# Altium integrated library Integrated_Library - 02.02.25 - 22.49.IntLib: 792 symbols (part 10 of 11) (continued)
## CMP-020-00021-3 (continued)

## CMP-020-00022-3
designator U?, comment STM32L452CEU6
ARM® Cortex®-M4 STM32L4 Microcontroller IC 32-Bit 80MHz 512KB (512K x 8) FLASH 48-UFQFPN (7x7); I/Os: 38; RAM Size: 160; Min Supply Voltage: 2V; ComponentLink1URL: http://www.st.com/; ComponentLink2Description: Datasheet; Mounting Technology: Surface Mount; ComponentLink2URL: http://www.st.com/st-web-ui/static/active/en/resource/technical/document/datasheet/CD00161566.pdf; Case/Package: UFQFN-48; Pins: 49; RoHS Compliant: Yes; ComponentLink1Description: Manufacturer URL
footprint STM-UFQFPN48_N (QFN, 48-Leads, Body 7.1x7.1mm, Pitch 0.5mm, Thermal Pad 5.6x5.6mm, IPC Medium Density)
footprint STM-UFQFPN48_N
pins: 1 VBAT (power), 2 PC13 (io), 3 PC14-OSC32_IN (io) "PC14/OSC32_IN", 4 PC15-OSC32_OUT (io) "PC15/OSC32_OUT", 5 OSC_IN (in) "OSC_IN/PD0", 6 OSC_OUT (out) "OSC_OUT/PD1", 7 NRST (io), 8 VSSA (power), 9 VDDA (power), 10 PA0-WKUP (io) "PA0/WKUP/USART2_CTS/ADC12_IN0/TIM2_CH1_ETR", 11 PA1 (io) "PA1/USART2_RTS/ADC12_IN1/TIM2_CH2", 12 PA2 (io) "PA2/USART2_TX/ADC12_IN2/TIM2_CH3", 13 PA3 (io) "PA3/USART2_RX/ADC12_IN3/TIM2_CH4", 14 PA4 (io) "PA4/SPI1_NSS/USART2_CK/ADC12_IN4", 15 PA5 (io) "PA5/SPI1_SCK/ADC12_IN5", 16 PA6 (io) "PA6/SPI1_MISO/ADC12_IN6/TIM3_CH1/TIM1_BKIN", 17 PA7 (io) "PA7/SPI1_MOSI/ADC12_IN7/TIM3_CH2/TIM1_CH1N", 18 PB0 (io) "PB0/ADC12_IN8/TIM3_CH3/TIM1_CH2N", 19 PB1 (io) "PB1/ADC12_IN9/TIM3_CH4/TIM1_CH3N", 20 PB2 (io) "PB2/BOOT1", 21 PB10 (io) "PB10/I2C2_SCL/USART3_TX/TIM2_CH3", 22 PB11 (io) "PB11/I2C2_SDA/USART3_RX/TIM2_CH4", 23 VSS (power), 24 VDD (power), 25 PB12 (io) "PB12/SPI2_NSS/I2C2_SMBAl/USART3_CK/TIM1_BKIN", 26 PB13 (io) "PB13/SPI2_SCK/USART3_CTS/TIM1_CH1N", 27 PB14 (io) "PB14/SPI2_MISO/USART3_RTS/TIM1_CH2N", 28 PB15 (io) "PB15/SPI2_MOSI/TIM1_CH3N", 29 PA8 (io) "PA8/USART1_CK/TIM1_CH1/MCO", 30 PA9 (io) "PA9/USART1_TX/TIM1_CH2", 31 PA10 (io) "PA10/USART1_RX/TIM1_CH3", 32 PA11 (io) "PA11/USART1_CTS/CANRX/USBDM/TIM1_CH4", 33 PA12 (io) "PA12/USART1_RTS/CANTX/USBDP/TIM1_ETR", 34 PA13 (io) "JTMS/SWDIO/PA13", 35 VSS (power), 36 VDDUSB (power), 37 PA14 (io) "JTCK/SWCLK/PA14", 38 PA15 (io) "JTDI/TIM2_CH1_ETR/PA15/SPI1_NSS", 39 PB3 (io) "JTDO/TIM2_CH2/PB3/TRACESWO/SPI1_SCK", 40 PB4 (io) "JNTRST/TIM3_CH1/PB4/SPI1_MISO", 41 PB5 (io) "PB5/ I2C1_SMBAI/TIM3_CH2/SPI1_MOSI", 42 PB6 (io) "PB6/I2C1_SCL/TIM4_CH1/USART1_TX", 43 PB7 (io) "PB7/I2C1_SDA/TIM4_CH2/USART1_RX", 44 BOOT0 (in), 45 PB8 (io) "PB8/TIM4_CH3/I2C1_SCL/CANRX", 46 PB9 (io) "PB9/TIM4_CH4/I2C1_SDA/CANTX", 47 VSS (power), 48 VDD (power), 49 EP

## CMP-021-00000-4
designator U?, comment SIM900
Quad-Band GSM / GPRS Module,  4 V, -30 to 80 degC, 68-Pin LCC; Manufacturer: Simcom; Voltage: 4V; Package Description: 68-Pin Leadless Ceramic Chip Carrier, Body 24 x 24 mm, Pitch 1 mm; Pins: 68; Datasheet URL: http://simcomm2m.com/UploadFile/TechnicalFile/SIM900_Hardware%20Design_V2.05.pdf; Package Reference: SIM900; Min Operating Temperature: -30°C; Max Operating Temperature: 80°C; Packaging: Unknown; Manufacturer URL: http://simcomm2m.com/; Case/Package: SIM900; Datasheet Version: Rev. 2.05, 08/2013; RoHS Compliant: Unknown; Mounting Technology: SM
footprint SIM-SIM900A_V (LCC, 68-Leads, Body 24x24mm, Pitch 1mm)
pins: 1 PWRKEY (in), 2 PWRKEY_OUT (out), 3 DTR (in), 4 RI (out), 5 DCD (out), 6 DSR (in), 7 CTS (out), 8 RTS (in), 9 TXD (out), 10 RXD (in), 11 DISP_CLK (out), 12 DISP_DATA (io), 13 DISP_D/C (out), 14 DISP_CS (out), 15 VDD_EXT (power), 16 ~{RESET} (in), 17 GND (power), 18 GND (power), 19 MIC_P (in), 20 MIC_N (in), 21 SPK_P (out), 22 SPK_N (out), 23 LINEIN_R (in), 24 LINEIN_L (in), 25 ADC (in), 26 VRTC (power), 27 DBG_TXD (out), 28 DBG_RXD (in), 29 GND (power), 30 SIM_VDD (out), 31 SIM_DATA (io), 32 SIM_CLK (out), 33 SIM_RST (out), 34 SIM_PRESENCE (in), 35 PWM1 (out), 36 PWM2 (out), 37 SDA (out), 38 SCL (io), 39 GND (power), 40 GPIO1/KBR4 (io), 41 GPIO2/KBR3 (io), 42 GPIO3/KBR2 (io), 43 GPIO4/KBR1 (io), 44 GPIO5/KBR0 (io), 45 GND (power), 46 GND (power), 47 GPIO6/KBC4 (io), 48 GPIO7/KBC3 (io), 49 GPIO8/KBC2 (io), 50 GPIO9/KBC1 (io), 51 GPIO10/KBC0 (io), 52 ~{ETLIGHT} (out), 53 GND (power), 54 GND (power), 55 VBAT (power), 56 VBAT (power), 57 VBAT (power), 58 GND (power), 59 GND (power), 60 RF_ANT (io), 61 GND (power), 62 GND (power), 63 GND (power), 64 GND (power), 65 GND (power), 66 STATUS (out), 67 GPIO11 (io), 68 GPIO12 (io)

## CMP-021-00001-2
designator U?, comment CC2540F256RHAR
2.4-GHz Bluetooth low Energy System-on-Chip, 256 KB, -40 to 85 degC, 40-Pin VQFN (RHA), Green (RoHS & no Sb/Br), Tape and Reel; Manufacturer: Texas Instruments (TI); Density: 128KB; RAM Size: 8KB; Max Supply Voltage: 3.6V; Min Supply Voltage: 2V; Data Rate: 1Mbps; RoHS Compliant: True; Case/Package: RHA0040J; Mounting Technology: SM; Package Quantity: 2500; Package Reference: RHA0040J; Packaging: TapeandReel; Max Operating Temperature: 85°C; Package Description: 40-Pin Quad Flat No-lead Package, Body 6 x 6 mm, Pitch 0.5 mm, Thermal Pad 4.5 x 4.5 mm; Pins: 40; Min Operating Temperature: -40°C; Datasheet URL: http://www.ti.com/lit/ds/symlink/cc2540.pdf; Datasheet Version: Apr-15; Manufacturer URL: http://www.ti.com/
footprint TI-RHA0040J_V (QFN, 40-Leads, Body 6x6mm, Pitch 0.5mm, Thermal Pad 4.5 x 4.5mm, TI Recommended)
pins: 1 DGND_USB (power) "Connect to GND", 2 USB_P (io) "USB P", 3 USB_N (io) "USB N", 4 DVDD_USB (power) "2-V-3.6-V digital power-supply connection", 5 P1_5 (io) "Port 1.5", 6 P1_4 (io) "Port 1.4", 7 P1_3 (io) "Port 1.3", 8 P1_2 (io) "Port 1.2", 9 P1_1 (io) "Port 1.1 - 20-mA drive capability", 10 DVDD2 (power) "2-V-3.6-V digital power-supply connection", 11 P1_0 (io) "Port 1.0 - 20-mA drive capability", 12 P0_7 (io) "Port 0.7", 13 P0_6 (io) "Port 0.6", 14 P0_5 (io) "Port 0.5", 15 P0_4 (io) "Port 0.4", 16 P0_3 (io) "Port 0.3", 17 P0_2 (io) "Port 0.2", 18 P0_1 (io) "Port 0.1", 19 P0_0 (io) "Port 0.0", 20 RESET_N (in) "Reset, active-low", 21 AVDD5 (power) "2-V-3.6-V analog power-supply connection", 22 XOSC_Q1 (in) "32-MHz crystal oscillator pin 1 or external-clock input", 23 XOSC_Q2 "32-MHz crystal oscillator pin 2", 24 AVDD3 (power) "2-V-3.6-V analog power-supply connection", 25 RF_P (io) "Positive RF input signal to LNA during RX. Positive RF output signal from PA during TX.", 26 RF_N (io) "Negative RF input signal to LNA during RX. Negative RF output signal from PA during TX.", 27 AVDD2 (power) "2-V-3.6-V analog power-supply connection", 28 AVDD1 (power) "2-V-3.6-V analog power-supply connection", 29 AVDD4 (power) "2-V-3.6-V analog power-supply connection", 30 RBIAS "External precision bias resistor for reference current", 31 AVDD6 (power) "2-V-3.6-V analog power-supply connection", 32 P2_4/XOSC32K_Q1 (io) "Port 2.4/32.768 kHz XOSC", 33 P2_3/XOSC32K_Q2 (io) "Port 2.3/32.768 kHz XOSC", 34 P2_2 (io) "Port 2.2", 35 P2_1 (io) "Port 2.1", 36 P2_0 (io) "Port 2.0", 37 P1_7 (io) "Port 1.7", 38 P1_6 (io) "Port 1.6", 39 DVDD1 (power) "2-V-3.6-V digital power-supply connection", 40 DCOUPL "1.8-V digital power-supply decoupling. Do not use for supplying external circuits.", 41 GND (power) "The ground pad must be connected to a solid ground plane."

## CMP-021-00002-2
designator U?, comment NRF52832-QFAA-R
Multiprotocol Bluetooth Smart, ANT/ANT+ and Proprietary System-on-Chip, 2.4 GHz, 256 KB FLASH, 1.7 to 3.6 V, -40 to 85 degC, 48-Pin QFN, RoHS, Tape and Reel; Manufacturer: Nordic Semiconductor; Mounting Technology: SM; RoHS Compliant: True; Manufacturer URL: http://www.nordicsemi.com/eng/Products/; Case/Package: QF-48; Datasheet URL: http://infocenter.nordicsemi.com/pdf/nRF52832_PS_v1.0.pdf; Package Description: 48-Pin Quad Flat No-lead Package, Body 6 x 6 mm, Pitch 0.4 mm, Thermal Pad 4.6 x 4.6 mm; Datasheet Version: Rev. 1.0, 02/2016; Package Reference: QF-48
footprint NRSC-QF-48_M (QFN, 48-Leads, Body 6.00x6.00mm, Pitch 0.40mm, Thermal Pad 4.60x4.60mm, IPC Low Density)
footprint NRSC-QF-48_N (QFN, 48-Leads, Body 6.00x6.00mm, Pitch 0.40mm, Thermal Pad 4.60x4.60mm, IPC Medium Density)
footprint NRSC-QF-48_L (QFN, 48-Leads, Body 6.00x6.00mm, Pitch 0.40mm, Thermal Pad 4.60x4.60mm, IPC High Density)
pins: 1 DEC1 "Power supply decoupling.", 2 P0.00/XL1 (io), 3 P0.01/XL2 (io), 4 P0.02/AIN0 (io), 5 P0.03/AIN1 (io), 6 P0.04/AIN2 (io), 7 P0.05/AIN3 (io), 8 P0.06 (io) "General purpose I/O pin.", 9 P0.07 (io) "General purpose I/O pin.", 10 P0.08 (io) "General purpose I/O pin.", 11 P0.09/NFC1 (io), 12 P0.10/NFC2 (io), 13 VDD (power) "Power-supply pin.", 14 P0.11 (io) "General purpose I/O pin.", 15 P0.12 (io) "General purpose I/O pin.", 16 P0.13 (io) "General purpose I/O pin.", 17 P0.14/TRACEDATA[3] (io), 18 P0.15/TRACEDATA[2] (io), 19 P0.16/TRACEDATA[1] (io), 20 P0.17 (io) "General purpose I/O pin", 21 P0.18/TRACEDATA[[0]/SWO (io), 22 P0.19 (io) "General purpose I/O pin", 23 P0.20/TRACECLK (io), 24 P0.21/nRESET (io), 25 SWDCLK (in) "Serial Wire Debug clock input for debug and programming.", 26 SWDIO (io) "Serial Wire Debug I/O for debug and programming.", 27 P0.22 (io) "General purpose I/O pin", 28 P0.23 (io) "General purpose I/O pin", 29 P0.24 (io) "General purpose I/O pin", 30 ANT (io) "Single-ended radio antenna connection.", 31 VSS (power) "Ground pin (Radio supply).", 32 DEC2 "1V3 regulator supply decoupling", 33 DEC3 "Power supply decoupling.", 34 XC1 (in) "Connection for 32 MHz crystal.", 35 XC2 "Connection for 32 MHz crystal.", 36 VDD (power) "Power-supply pin.", 37 P0.25 (io) "General purpose I/O pin", 38 P0.26 (io) "General purpose I/O pin", 39 P0.27 (io) "General purpose I/O pin", 40 P0.28/AN4 (io), 41 P0.29/AN5 (io), 42 P0.30/AN6 (io), 43 P0.31/AN7 (io), 44 NC "No connect pin. Leave unconnected.", 45 VSS (power) "Ground Pin.", 46 DEC4 "1V3 regulator supply decoupling.", 47 DCC (power) "DC/DC regulator output pin", 48 VDD (power) "Power-supply pin.", 49 EP (power) "Ground pad."

## CMP-021-00003-2
designator U?, comment HDG104-DN-2
HDG104-WiFi 802.11b+g System in Package, 3.3 V, -20 to 70 degC, 44-Pin QFN, RoHS, Tape and Reel; Manufacturer: H&D WIRELESS; Data Rate: 54Mbps; Nominal Supply Voltage: 3.3V; Pins: 48; Datasheet Version: Rev. PG5, 02/2011; Max Operating Temperature: 70°C; Package Description: 44-Pin Quad Flat No-lead Package, Body 7.7 x 7.1 mm, Pitch 0.6 mm; Packaging: TapeandReel; RoHS Compliant: True; Min Operating Temperature: -20°C; Package Quantity: 500; Case/Package: QFN; Mounting Technology: SM; Manufacturer URL: http://www.hdwireless.se/; Datasheet URL: https://datasheet.ciiva.com/46482/getdatasheetpartid-770464-46482058.pdf; Package Reference: QFN-44+4
footprint HDW-QFN-44+4_V (QFN, 44-Leads, Body 7.7x7.1mm, Pitch 0.6mm)
pins: 1 SDIO DAT0 (io) "SDIO Data 0, SDIO/SPI MISO", 2 SDIO DAT1 (io) "SDIO Data 1, SDIO/SPI IRQ", 3 GND (power) "Ground", 4 ANT_WLAN "Antenna Port (50 Ohm) for WLAN", 5 COEX4 "Do not connect", 6 ICE_TDI (in) "ICE Test Data Input, do not connect", 7 ICE_TRST (in) "ICE Test Reset, do not connect", 8 ICE_TCK (in) "ICE Test Clock, do not connect", 9 NC "Do not connect", 10 ICE_TMS (in) "ICE Test Mode Select, do not connect", 11 VPA (power) "Power supply for RF Power Amplifier", 12 ICE_TDO (out) "ICE Test Data output", 13 COEX3 "Do not connect", 14 COEX2 "Do not connect", 15 NC "Do not connect", 16 NC "Do not connect", 17 DVDD (power) "DIGITAL VDD 1.2V, de-couple with a 1uF capacitor to GND", 18 NC "Do not connect", 19 VCC_REG_VCO (power) "LDO Decoupling. Connect a 27pF capacitor to GND", 20 VCC (power) "Radio supply 3.3V, de-couple with a 1uF capacitor to GND", 21 COEX0 "Do not connect", 22 VCC_REG_PLL (power) "LDO Decoupling. Connect a 27pF capacitor to GND", 23 ~{SHUTDOWN} (in) "Shutdown pin. Active Low", 24 40MHz IN (in) "HFC Oscillator IN", 25 40MHz OUT (out) "HFC Oscillator OUT", 26 DCDC_ENABLE (in) "Connect to GND. Internal DC/DC not used", 27 VDD_CKL_12 (power) "HFC X-tal driver decoupling. Connect a 100nF capacitor to GND", 28 VDD_CKL_26 (power) "HFC PLL decoupling. Connect a 1uF capacitor to GND", 29 VBAT_32K (power) "Clock supply 3.3V. De-couple with a 100nF capacitor to GND", 30 TEST_EN (in) "Test Enable with internal pull down,. connect to GND", 31 DCO (power) "DC/DC Converter out. Leave open", 32 COEX1 "Do not connect", 33 VBAT_P (power) "Main supply 3.3V. De-couple with a 1uF capacitor to GND", 34 RESET_N (in) "Digital Reset with internal pull-up. Active Low", 35 EXT_PWR_EN (in) "External Power Control. Connect 100k resistor to GND", 36 LFC(SlEEP CLK) (in) "32KHz external clock.", 37 VDD_IO (power) "VDD_IO Supply for digital I/Os 3.3V, except SDIO domain", 38 NC "Do not connect", 39 ~{SDIO DAT3} (io) "SDIO Data 3, SDIO/SPI CARD_SELECT active low", 40 SDIO CMD (io) "SDIO Command, SDIO/SPI MOSI", 41 VDD_MAC_BB (power) "Internal 1.2V Decoupling, connect a 330nF capacitor to GND", 42 VDD_SDIO (power) "SDIO domain I/O Supply 3.3V", 43 SDIO DAT2 (io) "SDIO Data 2", 44 SDIO CLK (io) "SDIO Clock, SDIO/SPI CLK", 45 GND (power) "Ground", 46 GND (power) "Ground", 47 GND (power) "Ground", 48 GND (power) "Ground"

## CMP-021-00004-2
designator U?, comment nRF51822-QFAA-T
Multiprotocol Bluetooth 4.0 Low Energy RF SoC, 2.4 GHz, 1.8 to 3.6 V, 16 KB RAM, -25 to 75 degC, 48-Pin QFN, RoHS, Tray; Manufacturer: Nordic Semiconductor; Data Rate: 2000Kbps; Nominal Supply Voltage: 3.6V; RAM Size: 16KB; Package Description: 48-Pin Quad Flat No-lead Package, Body 6 x 6 mm, Pitch 0.4 mm, Thermal Pad 4.6 x 4.6 mm; Max Operating Temperature: 75°C; Min Operating Temperature: -25°C; Manufacturer URL: http://www.nordicsemi.com/eng/Products/; RoHS Compliant: True; Case/Package: Module; Datasheet Version: Rev. 3.1, 10/2014; Pins: 48; Mounting Technology: SM; Package Reference: QF-48; Package Quantity: 490; Packaging: Tray; Datasheet URL: http://www.nordicsemi.com/eng/content/download/13358/214991/file/nRF51822_PS%20v3.1.pdf
footprint NRSC-QF-48_M (QFN, 48-Leads, Body 6.00x6.00mm, Pitch 0.40mm, Thermal Pad 4.60x4.60mm, IPC Low Density)
footprint NRSC-QF-48_N (QFN, 48-Leads, Body 6.00x6.00mm, Pitch 0.40mm, Thermal Pad 4.60x4.60mm, IPC Medium Density)
footprint NRSC-QF-48_L (QFN, 48-Leads, Body 6.00x6.00mm, Pitch 0.40mm, Thermal Pad 4.60x4.60mm, IPC High Density)
pins: 1 VDD (power) "Power supply.", 2 DCC (power) "DC/DC output voltage to external LC filter.", 3 P0.30 (io) "General purpose I/O pin.", 4 P0.00/AREF0 (io), 5 P0.01/AIN2 (io), 6 P0.02/AIN3 (io), 7 P0.03/AIN4 (io), 8 P0.04/AIN5 (io), 9 P0.05/AIN6 (io), 10 P0.06/AIN7/AREF1 (io), 11 P0.07 (io) "General purpose I/O pin.", 12 VDD (power) "Power supply.", 13 VSS (power) "Ground (0 V)", 14 P0.08 (io) "General purpose I/O pin.", 15 P0.09 (io) "General purpose I/O pin.", 16 P0.10 (io) "General purpose I/O pin.", 17 P0.11 (io) "General purpose I/O pin.", 18 P0.12 (io) "General purpose I/O pin.", 19 P0.13 (io) "General purpose I/O pin.", 20 P0.14 (io) "General purpose I/O pin.", 21 P0.15 (io) "General purpose I/O pin.", 22 P0.16 (io) "General purpose I/O pin.", 23 SWDIO/nRESET (io), 24 SWDCLK (in) "Hardware debug and flash programming I/O.", 25 P0.17 (io) "General purpose I/O pin.", 26 P0.18 (io) "General purpose I/O pin.", 27 P0.19 (io) "General purpose I/O pin.", 28 P0.20 (io) "General purpose I/O pin.", 29 DEC2 "Power supply decoupling.", 30 VDD_PA (power) "Power supply output (+1.6 V) for on-chip RF power amp.", 31 ANT1 (io) "Differential antenna connection (TX and RX).", 32 ANT2 (io) "Differential antenna connection (TX and RX).", 33 VSS (power) "Ground (0 V).", 34 VSS (power) "Ground (0 V).", 35 AVDD (power) "Analog power supply (Radio).", 36 AVDD (power) "Analog power supply (Radio).", 37 XC1 (in) "Connection for 16/32 MHz crystal or external 16 MHz clock", 38 XC2 "Connection for 16/32 MHz crystal.", 39 DEC1 "Power supply decoupling.", 40 P0.21 (io) "General purpose I/O pin.", 41 P0.22 (io) "General purpose I/O pin.", 42 P0.23 (io) "General purpose I/O pin.", 43 P0.24 (io) "General purpose I/O pin.", 44 P0.25 (io) "General purpose I/O pin.", 45 P0.26/AIN0/XL2 (io), 46 P0.27/AIN1/XL1 (io), 47 P0.28 (io) "General purpose I/O pin.", 48 P0.29 (io) "General purpose I/O pin.", 49 EP (power)

## CMP-021-00005-2
designator U?, comment NRF8001-R2Q32-T
Single-Chip Bluetooth(R) Low Energy Solution, 1.9 to 3.6 V, -40 to 85 degC, 32-Pin QFN, RoHS, Tray; Manufacturer: Nordic Semiconductor; Max Supply Voltage: 3.6V; Data Rate: 1Mbps; Min Supply Voltage: 1.9V; Nominal Supply Voltage: 3V; Package Description: 32-Pin Quad Flat No-lead Package, Body 5 x 5 mm, Pitch 0.5 mm; Mounting Technology: SM; Datasheet Version: Rev. 1.1, 10/2012; Pins: 32; Case/Package: QFN; Min Operating Temperature: -40°C; Max Operating Temperature: 85°C; Packaging: Tray; Datasheet URL: https://datasheet.ciiva.com/4914/nrf8001-ps-v-1-1-2797-4914162.pdf; Manufacturer URL: http://www.nordicsemi.com/eng/Products/; RoHS Compliant: True; Package Quantity: 490; Package Reference: QFN-32
footprint NRSC-QFN-32_L (QFN, 32-Leads, Body 5.1x5.1mm, Pitch 0.50mm, Thermal Pad 3.6x3.6mm, IPC High Density)
footprint NRSC-QFN-32_N (QFN, 32-Leads, Body 5.1x5.1mm, Pitch 0.50mm, Thermal Pad 3.6x3.6mm, IPC Medium Density)
footprint NRSC-QFN-32_M (QFN, 32-Leads, Body 5.1x5.1mm, Pitch 0.50mm, Thermal Pad 3.6x3.6mm, IPC Low Density)
pins: 1 VDD (power) "Power supply (1.9 - 3.6V)", 2 DEC1 (power) "Regulated power supply output for decoupling purposes only.", 3 DEC2 (power) "Regulated power supply output for decoupling purposes only.", 4 XL2 "Connect to 32.768 kHz crystal oscillator.", 5 XL1 (in) "Connect to 32.768 kHz crystal oscillator or external 32.768 kHz clock reference.", 6 ACTIVE (out) "Device RF front end activity indicator.", 7 TXD (out) "UART (transmit) for Bluetooth low energy Direct Test Interface.", 8 VSS (power) "Ground (0V)", 9 VDD (power) "Power supply (1.9 - 3.6V)", 10 RXD (in) "UART (receive) for Bluetooth low energy Direct Test Interface.", 11 SCK (in) "ACI clock input.", 12 ~{REQN} (in) "ACI request pin (handshaking, active low).", 13 MOSI (in) "ACI Master Out Slave In.", 14 MISO (out) "ACI Master In Slave Out.", 15 NC "Not connected.", 16 ~{RDYN} (out) "ACI device ready indication (handshaking, active low).", 17 VSS (power) "Ground (0V)", 18 VSS (power) "Ground (0V)", 19 ~{RESET} (in) "Reset (active low)", 20 VDD_PA (power) "Regulated power supply output for on-chip RF Power amplifier.", 21 ANT1 "Differential antenna connection (TX and RX)", 22 ANT2 "Differential antenna connection (TX and RX)", 23 VSS (power) "Ground (0V)", 24 AVDD (power) "Analog power supply (1.9 - 3.6V DC)", 25 IREF "Current reference terminal.", 26 AVDD (power) "Analog power supply (1.9 - 3.6V)", 27 XC2 "Connection for 16 MHz crystal oscillator.", 28 XC1 (in) "Connection for 16 MHz crystal or external 16MHz reference.", 29 AVDD (power) "Analog power supply (1.9 - 3.6V DC)", 30 VSS (power) "Ground (0V)", 31 VSS (power) "Ground (0V)", 32 DCC (power) "Pulse Width Modulated (PWM) driver for the external LC filter if the DC/DC converter is enable.", 33 EP (power) "Ground (0V)"

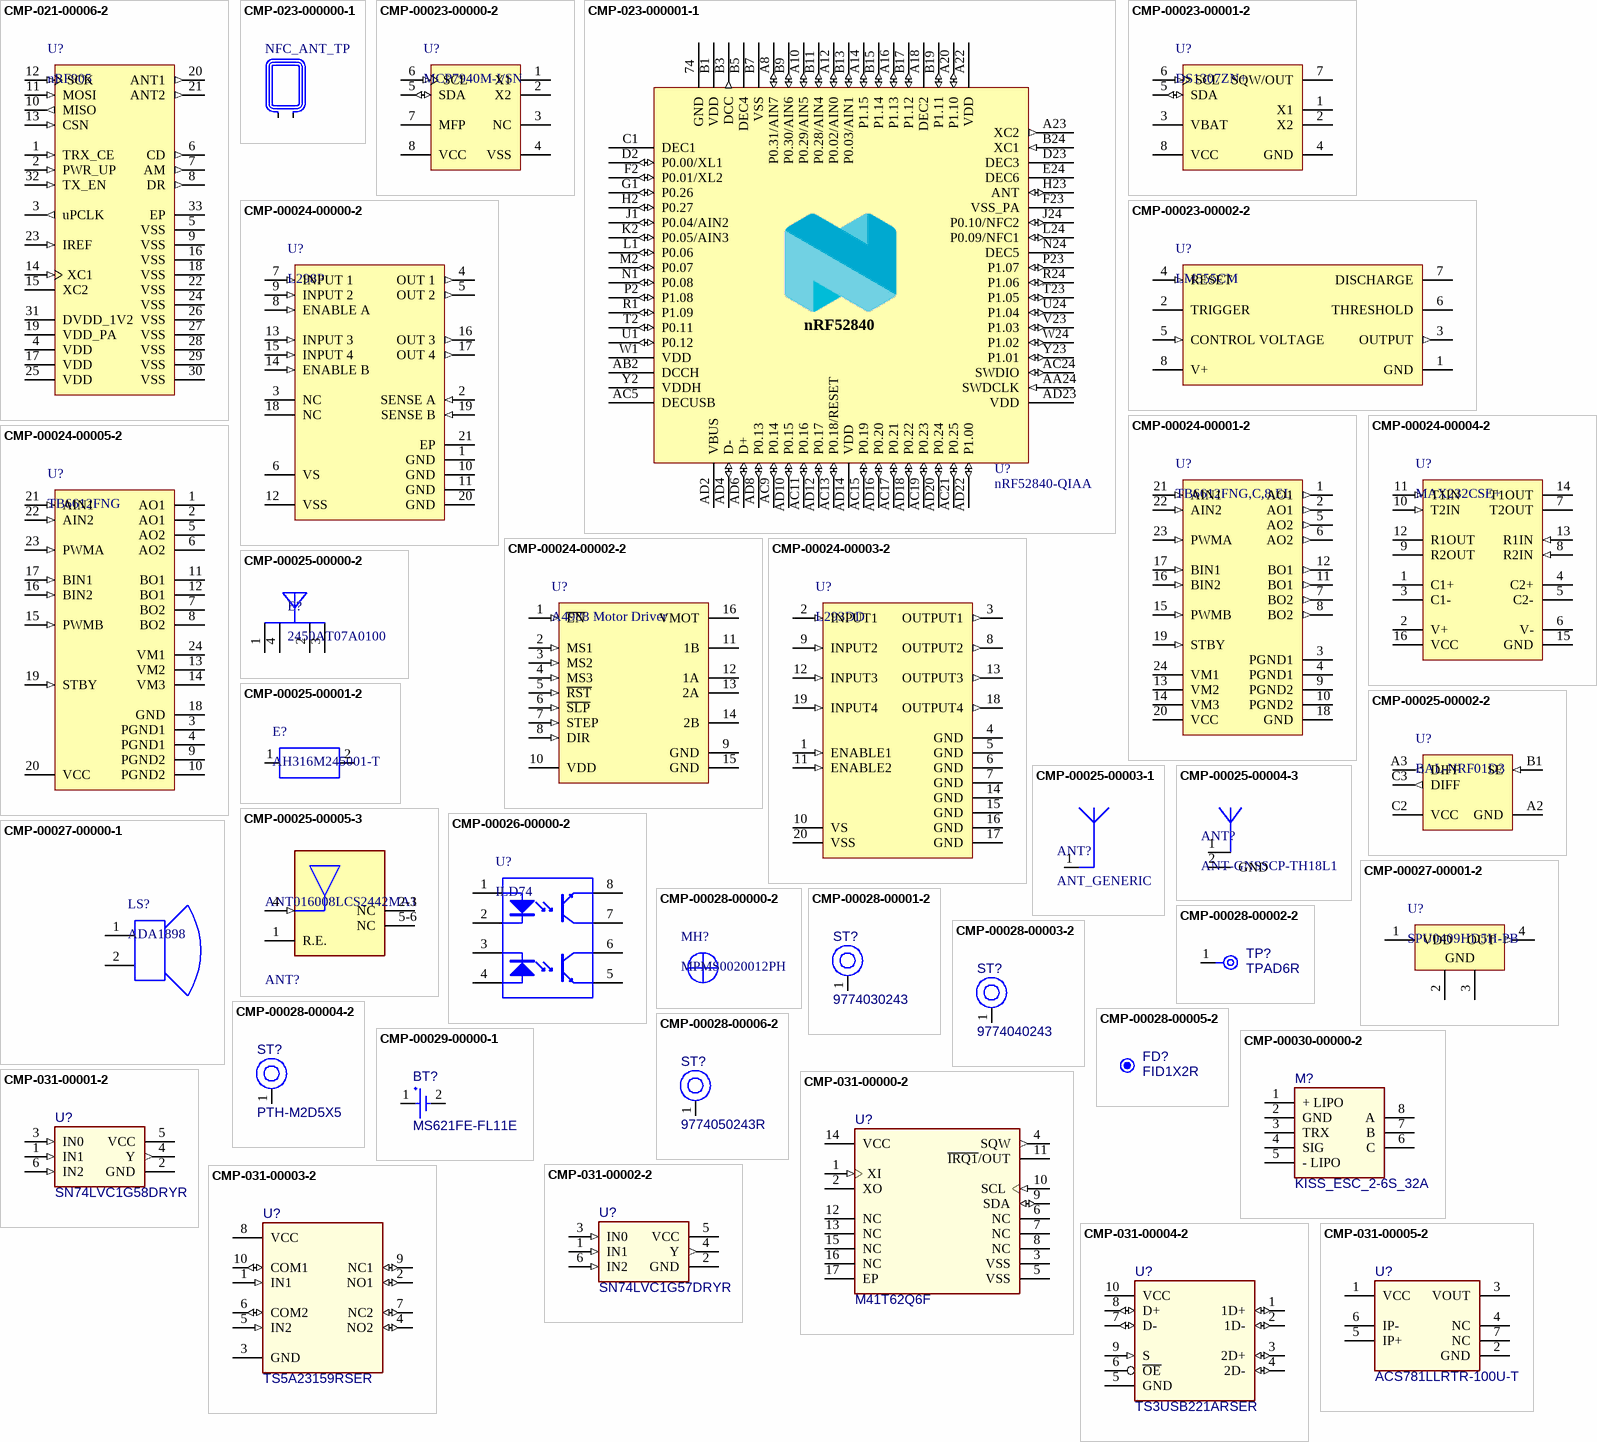
[diagram p25: symbols CMP-021-00006-2 to CMP-031-00005-2]

## CMP-021-00006-2
designator U?, comment nRF905
Single Chip Transceiver, 433 MHz, 1.9 to 3.6 V, -40 to 85 degC, 32-Pin QFN, RoHS, Tray; Manufacturer: Nordic Semiconductor; Interface: SPI; Frequency: 433MHz; Max Supply Voltage: 3.3V; Data Rate: 50Kbps; Min Supply Voltage: 1.9V; Mounting Technology: SM; Datasheet Version: Rev. 1.5, 04/2008; Min Operating Temperature: -40°C; RoHS Compliant: True; Manufacturer URL: http://www.nordicsemi.com/eng/Products/; Case/Package: QFN; Package Reference: QFN-32L; Pins: 32; Packaging: Tray; Package Quantity: 490; Datasheet URL: http://www.nordicsemi.com/eng/content/download/2452/29528/file/Product_Specification_nRF905_v1.5.pdf; Package Description: 32-Pin Quad Flat No-lead Package, Body 5 x 5 mm, Pitch 0.5 mm; Max Operating Temperature: 85°C
footprint NRSC-QFN-32L_N (QFN, 32-Leads, Body 5.00x5.00mm, Pitch 0.50mm, Thermal Pad 3.30x3.30mm, IPC Medium Density)
footprint NRSC-QFN-32L_M (QFN, 32-Leads, Body 5.00x5.00mm, Pitch 0.50mm, Thermal Pad 3.30x3.30mm, IPC Low Density)
footprint NRSC-QFN-32L_L (QFN, 32-Leads, Body 5.00x5.00mm, Pitch 0.50mm, Thermal Pad 3.30x3.30mm, IPC High Density)
pins: 1 TRX_CE (in) "Enables chip for receive and transmit", 2 PWR_UP (in) "Power up chip", 3 uPCLK (out) "Output clock, divided crystal oscillator full-swing clock", 4 VDD (power) "Power supply (+3V DC)", 5 VSS (power) "Ground (0V)", 6 CD (out) "Carrier Detect", 7 AM (out) "Address Match", 8 DR (out) "Receive and transmit Data Ready", 9 VSS (power) "Ground (0V)", 10 MISO (out) "SPI output", 11 MOSI (in) "SPI input", 12 SCK (in) "SPI clock", 13 CSN (in) "SPI enable, active low", 14 XC1 (in) "Crystal pin 1/ External clock reference pin", 15 XC2 "Crystal pin 2", 16 VSS (power) "Ground (0V)", 17 VDD (power) "Power supply (+3V DC)", 18 VSS (power) "Ground", 19 VDD_PA (power) "Positive supply (1.8V) to nRF905 power amplifier", 20 ANT1 (out) "Antenna interface 1", 21 ANT2 (out) "Antenna interface 2", 22 VSS (power) "Ground (0V)", 23 IREF (in) "Reference current", 24 VSS (power) "Ground (0V)", 25 VDD (power) "Power supply (+3V DC)", 26 VSS (power) "Ground (0V)", 27 VSS (power) "Ground (0V)", 28 VSS (power) "Ground (0V)", 29 VSS (power) "Ground (0V)", 30 VSS (power) "Ground (0V)", 31 DVDD_1V2 (power) "Low voltage positive digital supply output for de-coupling", 32 TX_EN (in) "TX_EN=”1”TX mode, TX_EN=”0”RX mode", 33 EP "Ground (0V)"

## CMP-023-000000-1
designator A?, comment NFC_ANT_TP  (no BOM)
NFC Antenna; Pad Count: 2; Source: nrf52840_qiaa.SCHLIB; Value: NFC Antenna; Design Item ID: NFC_ANT_TP; Component Type: Standard (No BOM); Footprint Doc: TP_2x1mm_TH; Pin Count: 2; Part Number: NFC_ANT_TP; Published: 2016-02-23; LatestRevisionDate: 2016-02-23
footprint TP_2x1mm_TH
footprint TP_2x1mm_TH
pins: 1, 2

## CMP-00023-00000-2
designator U?, comment MCP7940M-I/SN
Low-Cost I2C(TM) Real-Time Clock/Calendar with SRAM, 64 Bytes SRAM, 1.8 to 5.5 V, -40 to 85 degC, 8-pin SOIC (SN8), Tube; Manufacturer: Microchip Technology; Package Version: C04-057C; Max Supply Voltage: 5.5V; Non-volatile Memory Size: 64B; Min Supply Voltage: 1.8V; Package Quantity: 100; Package URL: http://www.microchip.com/stellent/groups/techpub_sg/documents/packagingspec/en012702.pdf; Packaging: Rail/Tube; Case/Package: SOIC; Max Operating Temperature: 85°C; Manufacturer URL: http://www.microchip.com/; Package Description: 8-Lead Plastic Small Outline, Body 4.9 x 3.9 mm, Pitch 1.27 mm; Datasheet Version: Rev. A, 02/2012; Interface: I2C; Min Operating Temperature: -40°C; Mounting Technology: SM; Package Reference: SOIC-SN8; RoHS Compliant: True; Pins: 48; Datasheet URL: http://ww1.microchip.com/downloads/en/DeviceDoc/22292A.pdf
footprint MCHP-SOIC-SN8_V (SOIC, 8-Leads, Body 4.90x3.90mm, Pitch 1.27mm)
pins: 1 X1 "Xtal Input, External Oscillator Input", 2 X2 "Xtal Output", 3 NC "Not Connected", 4 VSS (power) "Ground", 5 SDA (io) "Bidirectional Serial Data", 6 SCL (in) "Serial Clock", 7 MFP (oc) "Multi-Function Pin", 8 VCC (power) "+1.8V to +5.5V Power Supply"

## CMP-023-000001-1
designator U?, comment nRF52840-QIAA
Multi-protocol Bluetooth Low Energy, IEEE 802.15.4, ANT and 2.4GHz proprietary system-on-chip; Pad Count: 73; Value: nRF52840-QIAA; Part Number: nRF52840-QIAA; Design Item ID: nRF52840-QIAA; Published: 2017-08-21; LatestRevisionDate: 2017-08-21; Source: nrf52840_qiaa.SCHLIB; Footprint Doc: AQFN-73; Component Type: Standard; Pin Count: 74
footprint AQFN50P700X700X85_HS-74N
footprint AQFN50P700X700X85_HS-74N
pins: 74 GND (power), A8 P0.31/AIN7 (io), A10 P0.29/AIN5 (io), A12 P0.02/AIN0 (io), A14 P1.15 (io), A16 P1.13 (io), A18 DEC2 (power), A20 P1.10 (io), A22 VDD (power), A23 XC2 (out), AA24 SWDCLK (in), AB2 DCCH (power), AC5 DECUSB (power), AC9 P0.14 (io), AC11 P0.16 (io), AC13 P0.18/RESET (io), AC15 P0.19 (io), AC17 P0.21 (io), AC19 P0.23 (io), AC21 P0.25 (io), AC24 SWDIO (io), AD2 VBUS (power), AD4 D- (io), AD6 D+ (io), AD8 P0.13 (io), AD10 P0.15 (io), AD12 P0.17 (io), AD14 VDD (power), AD16 P0.20 (io), AD18 P0.22 (io), AD20 P0.24 (io), AD22 P1.00 (io), AD23 VDD (power), B1 VDD (power), B3 DCC (out), B5 DEC4 (power), B7 VSS (power), B9 P0.30/AIN6 (io), B11 P0.28/AIN4 (io), B13 P0.03/AIN1 (io), B15 P1.14 (io), B17 P1.12 (io), B19 P1.11 (io), B24 XC1 (in), C1 DEC1 (power), D2 P0.00/XL1 (io), D23 DEC3 (power), E24 DEC6 (power), F2 P0.01/XL2 (io), F23 VSS_PA (power), G1 P0.26 (io), H2 P0.27 (io), H23 ANT (io), J1 P0.04/AIN2 (io), J24 P0.10/NFC2 (io), K2 P0.05/AIN3 (io), L1 P0.06 (io), L24 P0.09/NFC1 (io), M2 P0.07 (io), N1 P0.08 (io), N24 DEC5 (power), P2 P1.08 (io), P23 P1.07 (io), R1 P1.09 (io), R24 P1.06 (io), T2 P0.11 (io), T23 P1.05 (io), U1 P0.12 (io), U24 P1.04 (io), V23 P1.03 (io), W1 VDD (power), W24 P1.02 (io), Y2 VDDH (power), Y23 P1.01 (io)
text: nRF52840

## CMP-00023-00001-2
designator U?, comment DS1307ZN+
I2C Real-Time Clock, 4.5 to 5.5 V, -40 to 85 degC, 8-Pin SOIC, RoHS, Tube; Manufacturer: Maxim; Max Supply Voltage: 5.5V; Min Supply Voltage: 4.5V; Outputs: 1; Package Version: Rev. D, 10/2012; Clock Frequency: 32.768KHz; Interface: Serial; Max Operating Temperature: 85°C; RoHS Compliant: True; Packaging: Rail/Tube; Manufacturer URL: http://www.maximintegrated.com/; Package Quantity: 100; Datasheet URL: http://datasheets.maximintegrated.com/en/ds/DS1307.pdf; Package Description: 8-Pin Small-Outline IC, Narrow (0.15in) (S8-2), Body 4.90 x 3.90 mm, Pitch 1.27 mm; Mounting Technology: SM; Package Reference: S8-2; Pins: 8; Case/Package: SOIC; Datasheet Version: Mar-15; Package URL: http://pdfserv.maximintegrated.com/package_dwgs/21-0041.PDF; Min Operating Temperature: -40°C
footprint MAXM-S8-2_M (SOIC, 8-Leads, Body 5x4mm, Pitch 1.27mm, IPC Low Density)
footprint MAXM-S8-2_N (SOIC, 8-Leads, Body 5x4mm, Pitch 1.27mm, IPC Medium Density)
footprint MAXM-S8-2_L (SOIC, 8-Leads, Body 5x4mm, Pitch 1.27mm, IPC High Density)
pins: 1 X1 "Connections for Standard 32.768kHz Quartz Crystal.", 2 X2 "Connections for Standard 32.768kHz Quartz Crystal.", 3 VBAT (power) "Backup Supply Input for Any Standard 3V Lithium Cell or Other Energy Source.", 4 GND (power) "Ground", 5 SDA (io) "Serial Data Input/Output.", 6 SCL (in) "Serial Clock Input.", 7 SQW/OUT (oc) "Square Wave/Output Driver.", 8 VCC (power) "Primary Power Supply."

## CMP-00023-00002-2
designator U?, comment LM555CM
Highly Stable 555 Timer for Generating Accurate Time Delays and Oscillation, 4.5 to 16 V, 0 to 70 degC, 8-Pin SOIC (D), Tube; Manufacturer: Texas Instruments (TI); Package Version: 4040047-3/M, 06/2011; Frequency: 100kHz; Max Supply Voltage: 16V; Max Ouput Current: -200mA; Min Supply Voltage: 4.5V; Power: 1.18W; Nominal Supply Current: 3mA; Channels: 1; Manufacturer URL: http://www.ti.com/; Pins: 8; Packaging: Rail/Tube; Datasheet Version: SNAS548D, 01/2015; RoHS Compliant: True; Package URL: http://www.ti.com/lit/ml/msoi002j/msoi002j.pdf; Package Reference: D0008A; Package Quantity: 95; Datasheet URL: http://www.ti.com/lit/ds/symlink/lm555.pdf; Min Operating Temperature: 0°C; Mounting Technology: SM; Max Operating Temperature: 70°C; Case/Package: SOIC; Package Description: 8-Pin Small Outline Integrated Circuit, Body 4.9 x 3.9 mm, Pitch 1.27 mm
footprint D0008A_M (SOIC, 8-Leads, Body 5x4mm, Pitch 1.27mm, IPC Low Density)
footprint D0008A_N (SOIC, 8-Leads, Body 5x4mm, Pitch 1.27mm, IPC Medium Density)
footprint D0008A_L (SOIC, 8-Leads, Body 5x4mm, Pitch 1.27mm, IPC High Density)
pins: 1 GND (power) "Ground reference voltage", 2 TRIGGER "Responsible for transition of the flip-flop from set to reset. The output of the timer depends on the amplitude of the external trigger pulse applied to this pin", 3 OUTPUT (out) "Output driven waveform", 4 RESET (in) "Negative pulse applied to this pin to disable or reset the timer. When not used for reset purposes, it should be connected to VCC to avoid false triggering", 5 CONTROL VOLTAGE (in) "Controls the threshold and trigger levels. It determines the pulse width of the output waveform. An external voltage applied to this pin can also be used to modulate the output waveform", 6 THRESHOLD "Compares the voltage applied to the terminal with a reference voltage of 2/3 Vcc. The amplitude of voltage applied to this terminal is responsible for the set state of the flip-flop", 7 DISCHARGE (oc) "Open collector output which discharges a capacitor between intervals (in phase with output). It toggles the output from high to low when voltage reaches 2/3 of the supply voltage", 8 V+ (power) "Supply voltage with respect to GND"

## CMP-00024-00000-2
designator U?, comment L298P
Dual Full-Bridge Driver, 4.5 to 7 V, -25 to 130 degC, 20-Pin SOIC, RoHS, Tube; Manufacturer: STMicroelectronics; Max Supply Voltage: 46V; Outputs: 4; Nominal Supply Voltage: 42V; Output Current: 2A; Min Supply Voltage: 4.8V; Max Operating Temperature: 130°C; Package Reference: PowerSO20; Manufacturer URL: http://www.st.com/; Package Quantity: 31; Case/Package: SOIC; Min Operating Temperature: -25°C; Datasheet Version: Jan-00; Pins: 20; Datasheet URL: http://www.st.com/content/ccc/resource/technical/document/datasheet/82/cc/3f/39/0a/29/4d/f0/CD00000240.pdf/files/CD00000240.pdf/jcr:content/translations/en.CD00000240.pdf; Packaging: Rail/Tube; Package Description: 20-Pin Small Outline Integrated Circuits, Body 15.9 x 11 mm, Pitch 1.27 mm; Mounting Technology: SM; RoHS Compliant: True
footprint STM-PowerSO20_M (SOIC, 20-Leads, Body 16x11.1mm, Pitch 1.27mm, Thermal Pad 16x6.2mm, IPC Low Density)
footprint STM-PowerSO20_N (SOIC, 20-Leads, Body 16x11.1mm, Pitch 1.27mm, Thermal Pad 16x6.2mm, IPC Medium Density)
footprint STM-PowerSO20_L (SOIC, 20-Leads, Body 16x11.1mm, Pitch 1.27mm, Thermal Pad 16x6.2mm, IPC High Density)
pins: 1 GND (power) "Ground.", 2 SENSE A (in) "Between this pin and ground is connected the sense resistor to control the current of the load.", 3 NC "Not Connected", 4 OUT 1 (out) "Outputs of the Bridge A; the current that flows through the load connected between these two pins is monitored at pin 1.", 5 OUT 2 (out) "Outputs of the Bridge A; the current that flows through the load connected between these two pins is monitored at pin 1.", 6 VS (power) "Supply Voltage for the Power Output Stages. A non-inductive 100nF capacitor must be connected between this pin and ground.", 7 INPUT 1 (in) "TTL Compatible Inputs of the Bridge A.", 8 ENABLE A (in) "TTL Compatible Enable Input: the L state disables the bridge A (enable A) and/or the bridge B (enable B).", 9 INPUT 2 (in) "TTL Compatible Inputs of the Bridge A.", 10 GND (power) "Ground.", 11 GND (power) "Ground.", 12 VSS (power) "Supply Voltage for the Logic Blocks. A100nF capacitor must be connected between this pin and ground.", 13 INPUT 3 (in) "TTL Compatible Inputs of the Bridge B.", 14 ENABLE B (in) "TTL Compatible Enable Input: the L state disables the bridge A (enable A) and/or the bridge B (enable B).", 15 INPUT 4 (in) "TTL Compatible Inputs of the Bridge B.", 16 OUT 3 (out) "Outputs of the Bridge B. The current that flows through the load connected between these two pins is monitored at pin 15.", 17 OUT 4 (out) "Outputs of the Bridge B. The current that flows through the load connected between these two pins is monitored at pin 15.", 18 NC "Not Connected", 19 SENSE B (in) "Between this pin and ground is connected the sense resistor to control the current of the load.", 20 GND (power) "Ground.", 21 EP "PAD"